# Altium footprint library SoM_Artix.PcbLib: 239 footprints (part 7 of 15)
Each footprint in its own frame and in the unit in brackets; x right, y up, seen from the top. Pads: shape width x height; smd on the part's side, far side on the other; paste and mask are expansions set on the pad; w line width, h text height; cw(c..) or ccw(c..) is an arc to the next point about the centre after c.
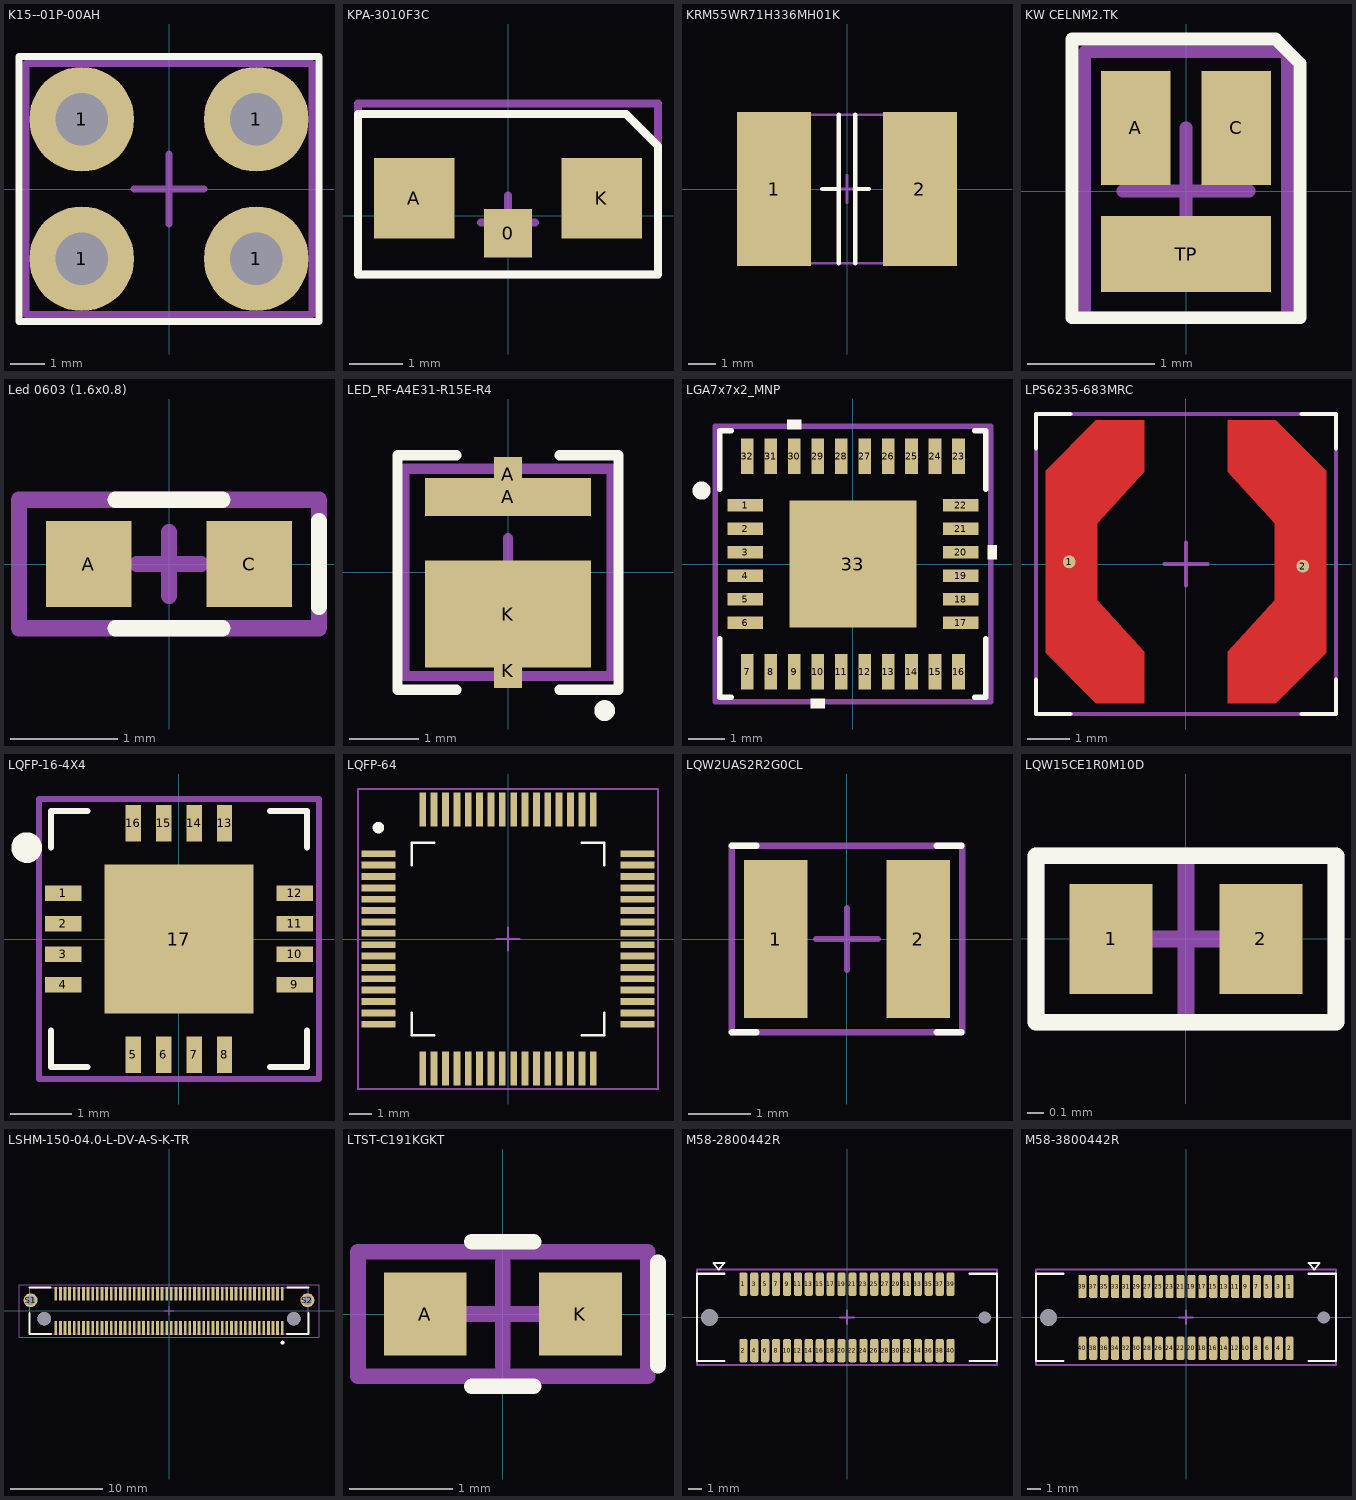
[diagram p6: the footprints below, top view; thin cyan lines are the x and y axes]

## K15--01P-00AH [mm]
height 7
pads (4):
  round 3 hole 1.5: 1(-2.5,-2) 1(-2.5,2) 1(2.5,-2) 1(2.5,2)
Top Overlay:
  lines w0.2: -4.3,-3.8 4.3,-3.8 4.3,3.8 -4.3,3.8 -4.3,-3.8
Mechanical 13:
  lines w0.2: -1,0 1,0 ; 0,-1 0,1 ; -4.1,-3.6 4.1,-3.6 4.1,3.6 -4.1,3.6 -4.1,-3.6
3D body "9586.10.02.105#Контакт.STEP": height 7.2, standoff -2.8, extent -4,-3.5 4,3.5

## KPA-3010F3C [mm]
pads (3):
  rect 0.9x0.9 smd: 0(0,-0.325)
  rect 1.5x1.5 smd: A(-1.75,0.325) K(1.75,0.325)
Top Overlay:
  lines w0.15: -2.8,-1.1 -2.8,1.9 2.2,1.9 2.8,1.3 2.8,-1.1 -2.8,-1.1
Mechanical 15:
  lines w0.15: -0.5,-0.125 0.5,-0.125 ; 0,-0.625 0,0.375 ; -2.8,-1.1 -2.8,2.1 2.8,2.1 2.8,-1.1 -2.8,-1.1
3D body "User Library-APA3010GCCK_GREEN.step": height 1, standoff 0, extent -1.5,-0.15 1.5,1.85

## KRM55WR71H336MH01K [mm]
height 4.8
pads (2):
  rect 2.7x5.6 smd: 1(-2.65,0) 2(2.65,0)
Top Overlay:
  lines w0.15: -0.9,0 -0.3,0 ; -0.3,-2.7 -0.3,2.7 ; 0.3,-2.7 0.3,2.7 ; 0.3,0 0.8,0
Mechanical 13:
  lines w0.1: -0.5,0 0.5,0 ; 0,-0.5 0,0.5 ; -3.2,-2.7 3.2,-2.7 3.2,2.7 -3.2,2.7 -3.2,-2.7
3D body "User Library-KMR55_murata v2.step": height 6.6, standoff 0, extent -3.24,-2.65 3.197,2.658

## KW CELNM2.TK [mm]
pads (3):
  rect 0.55x0.9 smd paste-0.05 mask+0: A(-0.398,0.498) C(0.398,0.498)
  rect 1.34x0.6 smd paste-2539.97 mask+0: TP(0,-0.498)
Top Overlay:
  lines w0.1: -0.9,-1 0.9,-1 0.9,1.007 0.707,1.2 -0.9,1.2 -0.9,-1
Top Paste:
  region: 0.62,-0.25 0.12,-0.25 0.12,-0.75 0.62,-0.75
  rectangle: -0.62,-0.75 -0.12,-0.25
Mechanical 15:
  lines w0.1: -0.5,0 0.5,0 ; 0,-0.5 0,0.5 ; -0.8,-1 0.8,-1 0.8,1.1 -0.8,1.1 -0.8,-1
3D body "KW_CELNM2_TK.STEP": height 0.73, standoff 0, extent -0.75,-0.879 0.75,1.021

## Led 0603 (1.6x0.8) [mm]
pads (2):
  rect 0.8x0.8 smd mask+0.07: A(-0.75,0) C(0.75,0)
Top Overlay:
  lines w0.15: -0.5,-0.6 0.5,-0.6 ; -0.5,0.6 0.5,0.6 ; 1.4,-0.4 1.4,0.4
Mechanical 15:
  lines w0.15: -0.3,0 0.3,0 ; 0,-0.3 0,0.3 ; -1.4,-0.6 -1.4,0.6 1.4,0.6 1.4,-0.6 -1.4,-0.6
3D body "User Library-LED_0603_G.STEP": height 0.6, standoff 0, extent -0.8,-0.4 0.8,0.4

## LED_RF-A4E31-R15E-R4 [mm]
pads (4):
  rect 2.4x0.55 smd: A(0,1.095)
  rect 0.4x0.5 smd: A(0,1.425) K(0,-1.425)
  rect 2.4x1.55 smd: K(0,-0.605)
Top Overlay:
  circle w0.2: c1.4,-2 r0.05
  lines w0.15: -0.75,-1.7 -1.6,-1.7 -1.6,1.7 -0.75,1.7 ; 0.75,-1.7 1.6,-1.7 1.6,1.7 0.75,1.7
Mechanical 13:
  lines w0.15: -0.5,0 0.5,0 ; 0,-0.5 0,0.5 ; -1.5,-1.5 1.5,-1.5 1.5,1.5 -1.5,1.5 -1.5,-1.5
3D body "User Library-LED-3030.STEP": height 0.51, standoff 0, extent -1.524,-1.524 1.524,1.524

## LGA7x7x2_MNP [mil]
pads (33):
  rect 39x14 smd paste+0 mask+1.97: 1(-117.5,63.98) 2(-117.5,38.39) 3(-117.5,12.8) 4(-117.5,-12.8) 5(-117.5,-38.39) 6(-117.5,-63.98) 17(117.5,-63.98) 18(117.5,-38.39) 19(117.5,-12.8) 20(117.5,12.8) 21(117.5,38.39) 22(117.5,63.98)
  rect 14x39 smd paste+0 mask+1.97: 7(-115.16,-117.5) 8(-89.57,-117.5) 9(-63.98,-117.5) 10(-38.39,-117.5) 11(-12.8,-117.5) 12(12.8,-117.5) 13(38.39,-117.5) 14(63.98,-117.5) 15(89.57,-117.5) 16(115.16,-117.5) 23(115.16,117.5) 24(89.57,117.5) 25(63.98,117.5) 26(38.39,117.5) 27(12.8,117.5) 28(-12.8,117.5) 29(-38.39,117.5) 30(-63.98,117.5) 31(-89.57,117.5) 32(-115.16,117.5)
  rect 138x138 smd paste-68.5 mask+1.97: 33(0,0)
Top Overlay:
  circle w9.84: c-165,80 r5
  region: -30.89,-147 -45.89,-147 -45.89,-157 -30.89,-157
  region: 147,20.3 157,20.3 157,5.3 147,5.3
  region: -56.48,147 -71.48,147 -71.48,157 -56.48,157
  lines w6: -145,-81.35 -145,-145 -132.53,-145 ; -145,81.35 -145,145 -132.53,145 ; 132.53,-145 145,-145 145,-81.35 ; 132.53,145 145,145 145,81.35
Top Paste:
  region: -3.94,65.06 -65.06,65.06 -65.06,3.94 -3.94,3.94
  region: -3.94,-3.94 -65.06,-3.94 -65.06,-65.06 -3.94,-65.06
  region: 65.06,65.06 3.94,65.06 3.94,3.94 65.06,3.94
  region: 65.06,-3.94 3.94,-3.94 3.94,-65.06 65.06,-65.06
Mechanical 15:
  lines w6: -150,-150 -150,-80.98 -150,80.98 -150,150 -132.16,150 132.16,150 150,150 150,80.98 150,-80.98 150,-150 132.16,-150 -132.16,-150 -150,-150
3D body "LGA7x7x2_MNP.step": height 83.11, standoff 0, extent -140,-140 140,140

## LPS6235-683MRC [mm]
pads (2):
  round 0.3 smd mask+0.102: 1(-2.725,0.05) 2(2.725,-0.05)
Top Layer:
  region: -2.1,-3.25 -3.275,-2.075 -3.275,2.175 -2.1,3.35 -0.975,3.35 -0.975,2.15 -2.075,0.95 -2.075,-0.85 -0.975,-2.05 -0.975,-3.25
  region: 2.1,-3.25 3.275,-2.075 3.275,2.175 2.1,3.35 0.975,3.35 0.975,2.15 2.075,0.95 2.075,-0.85 0.975,-2.05 0.975,-3.25
Top Overlay:
  lines w0.1: -3.5,-2.7 -3.5,-3.5 -2.7,-3.5 ; -3.5,2.7 -3.5,3.5 -2.7,3.5 ; 2.7,-3.5 3.5,-3.5 3.5,-2.7 ; 2.7,3.5 3.5,3.5 3.5,2.7
Mechanical 15:
  lines w0.1: -0.5,0 0.5,0 ; 0,-0.5 0,0.5 ; -3.5,-3.5 -3.5,3.5 3.5,3.5 3.5,-3.5 -3.5,-3.5
3D body "Coilcraft-LPS6235.step": height 3.5, standoff 0, extent -3.038,-3.038 3.038,3.038

## LQFP-16-4X4 [mm]
pads (17):
  rect 0.6x0.25 smd mask+0.05: 1(-1.9,0.75) 2(-1.9,0.25) 3(-1.9,-0.25) 4(-1.9,-0.75) 9(1.9,-0.75) 10(1.9,-0.25) 11(1.9,0.25) 12(1.9,0.75)
  rect 0.25x0.6 smd mask+0.05: 5(-0.75,-1.9) 6(-0.25,-1.9) 7(0.25,-1.9) 8(0.75,-1.9) 13(0.75,1.9) 14(0.25,1.9) 15(-0.25,1.9) 16(-0.75,1.9)
  rect 2.45x2.45 smd mask+0.05: 17(0,0)
Top Overlay:
  circle w0.25: c-2.5,1.5 r0.127
  lines w0.1: -2.1,-1.5 -2.1,-2.1 -1.5,-2.1 ; -2.1,1.5 -2.1,2.1 -1.5,2.1 ; 1.5,-2.1 2.1,-2.1 2.1,-1.5 ; 1.5,2.1 2.1,2.1 2.1,1.5
Mechanical 15:
  lines w0.1: -0.5,0 0.5,0 ; 0,-0.5 0,0.5 ; -2.3,-2.3 2.3,-2.3 2.3,2.3 -2.3,2.3 -2.3,-2.3
3D body "User Library-WQFN-16 4x4mm 0_5mmPitch.step": height 0.8, standoff -0.01, extent -2.01,-2.01 2.01,2.01

## LQFP-64 [mm]
pads (64):
  rect 1.5x0.3 smd mask+0.05: 1(-5.7,3.75) 2(-5.7,3.25) 3(-5.7,2.75) 4(-5.7,2.25) 5(-5.7,1.75) 6(-5.7,1.25) 7(-5.7,0.75) 8(-5.7,0.25) 9(-5.7,-0.25) 10(-5.7,-0.75) 11(-5.7,-1.25) 12(-5.7,-1.75) 13(-5.7,-2.25) 14(-5.7,-2.75) 15(-5.7,-3.25) 16(-5.7,-3.75) 33(5.7,-3.75) 34(5.7,-3.25) 35(5.7,-2.75) 35(5.7,-1.25) 36(5.7,-2.25) 37(5.7,-1.75) 39(5.7,-0.75) 40(5.7,-0.25) 41(5.7,0.25) 42(5.7,0.75) 43(5.7,1.25) 44(5.7,1.75) 45(5.7,2.25) 46(5.7,2.75) 47(5.7,3.25) 48(5.7,3.75)
  rect 0.3x1.5 smd mask+0.05: 17(-3.75,-5.7) 18(-3.25,-5.7) 19(-2.75,-5.7) 20(-2.25,-5.7) 21(-1.75,-5.7) 22(-1.25,-5.7) 23(-0.75,-5.7) 24(-0.25,-5.7) 25(0.25,-5.7) 26(0.75,-5.7) 27(1.25,-5.7) 28(1.75,-5.7) 29(2.25,-5.7) 30(2.75,-5.7) 31(3.25,-5.7) 32(3.75,-5.7) 49(3.75,5.7) 50(3.25,5.7) 51(2.75,5.7) 52(2.25,5.7) 53(1.75,5.7) 54(1.25,5.7) 55(0.75,5.7) 56(0.25,5.7) 57(-0.25,5.7) 58(-0.75,5.7) 59(-1.25,5.7) 60(-1.75,5.7) 61(-2.25,5.7) 62(-2.75,5.7) 63(-3.25,5.7) 64(-3.75,5.7)
Top Overlay:
  circle w0.25: c-5.7,4.9 r0.127
  lines w0.1: -4.238,-3.237 -4.238,-4.237 -3.238,-4.237 ; -4.237,3.238 -4.237,4.238 -3.237,4.238 ; 3.237,-4.238 4.237,-4.238 4.237,-3.238 ; 3.238,4.237 4.238,4.237 4.238,3.237
Mechanical 15:
  lines w0.1: -0.5,0 0.5,0 ; 0,-0.5 0,0.5 ; -6.6,-6.6 -6.6,6.6 6.6,6.6 6.6,-6.6 -6.6,-6.6
3D body "User Library-LQFP64-2.STEP": height 1.62, standoff -0.01, extent -6.072,-6.072 6.072,6.072

## LQW2UAS2R2G0CL [mm]
pads (2):
  rect 1.02x2.54 smd mask+0.05: 1(-1.145,0) 2(1.145,0)
Top Overlay:
  lines w0.1: -1.855,-1.5 -1.455,-1.5 ; -1.855,1.5 -1.455,1.5 ; 1.445,-1.5 1.845,-1.5 ; 1.445,1.5 1.845,1.5
Mechanical 15:
  lines w0.1: -0.5,0 0.5,0 ; 0,-0.5 0,0.5 ; -1.855,-1.5 -1.855,1.5 1.855,1.5 1.855,-1.5 -1.855,-1.5
3D body "Coilcraft-1008CS.step": height 2.48, standoff -0.01, extent -1.46,-1.395 1.46,1.395

## LQW15CE1R0M10D [mm]
pads (2):
  rect 0.5x0.66 smd mask+0.05: 1(-0.45,0) 2(0.45,0)
Top Overlay:
  lines w0.1: -0.9,-0.5 -0.9,0.5 0.9,0.5 0.9,-0.5 -0.9,-0.5
Mechanical 15:
  lines w0.1: -0.5,0 0.5,0 ; 0,-0.5 0,0.5 ; -0.9,-0.5 0.9,-0.5 0.9,0.5 -0.9,0.5 -0.9,-0.5
3D body "User Library-INDC1005X50-MURATA_LQW15A.step": height 0.51, standoff 0, extent -0.5,-0.3 0.5,0.3

## LSHM-150-04.0-L-DV-A-S-K-TR [mm]
height 5.6
pads (104):
  rect 0.3x1.5 smd: 1(12.25,-1.85) 2(12.25,1.85) 3(11.75,-1.85) 4(11.75,1.85) 5(11.25,-1.85) 6(11.25,1.85) 7(10.75,-1.85) 8(10.75,1.85) 9(10.25,-1.85) 10(10.25,1.85) 11(9.75,-1.85) 12(9.75,1.85) 13(9.25,-1.85) 14(9.25,1.85) 15(8.75,-1.85) 16(8.75,1.85) 17(8.25,-1.85) 18(8.25,1.85) 19(7.75,-1.85) 20(7.75,1.85) 21(7.25,-1.85) 22(7.25,1.85) 23(6.75,-1.85) 24(6.75,1.85) 25(6.25,-1.85) 26(6.25,1.85) 27(5.75,-1.85) 28(5.75,1.85) 29(5.25,-1.85) 30(5.25,1.85) 31(4.75,-1.85) 32(4.75,1.85) 33(4.25,-1.85) 34(4.25,1.85) 35(3.75,-1.85) 36(3.75,1.85) 37(3.25,-1.85) 38(3.25,1.85) 39(2.75,-1.85) 40(2.75,1.85) 41(2.25,-1.85) 42(2.25,1.85) 43(1.75,-1.85) 44(1.75,1.85) 45(1.25,-1.85) 46(1.25,1.85) 47(0.75,-1.85) 48(0.75,1.85) 49(0.25,-1.85) 50(0.25,1.85) 51(-0.25,-1.85) 52(-0.25,1.85) 53(-0.75,-1.85) 54(-0.75,1.85) 55(-1.25,-1.85) 56(-1.25,1.85) 57(-1.75,-1.85) 58(-1.75,1.85) 59(-2.25,-1.85) 60(-2.25,1.85) 61(-2.75,-1.85) 62(-2.75,1.85) 63(-3.25,-1.85) 64(-3.25,1.85) 65(-3.75,-1.85) 66(-3.75,1.85) 67(-4.25,-1.85) 68(-4.25,1.85) 69(-4.75,-1.85) 70(-4.75,1.85) 71(-5.25,-1.85) 72(-5.25,1.85) 73(-5.75,-1.85) 74(-5.75,1.85) 75(-6.25,-1.85) 76(-6.25,1.85) 77(-6.75,-1.85) 78(-6.75,1.85) 79(-7.25,-1.85) 80(-7.25,1.85) 81(-7.75,-1.85) 82(-7.75,1.85) 83(-8.25,-1.85) 84(-8.25,1.85) 85(-8.75,-1.85) 86(-8.75,1.85) 87(-9.25,-1.85) 88(-9.25,1.85) 89(-9.75,-1.85) 90(-9.75,1.85) 91(-10.25,-1.85) 92(-10.25,1.85) 93(-10.75,-1.85) 94(-10.75,1.85) 95(-11.25,-1.85) 96(-11.25,1.85) 97(-11.75,-1.85) 98(-11.75,1.85) 99(-12.25,-1.85) 100(-12.25,1.85)
  round 1.5 hole 1: S1(-14.975,1.15) S2(14.975,1.15)
  round 1.45 hole 1.45 unplated: ""(-13.5,-0.85) ""(13.5,-0.85)
Top Overlay:
  circle w0.2: c12.279,-3.429 r0.1
  lines w0.2: -15.075,-0.3 -15.075,-2.49 ; -15.075,-0.2 -15.075,-2.49 ; -15.075,2.51 -12.8,2.51 ; -12.8,-2.49 -15.075,-2.49 ; -12.75,-2.49 -15.075,-2.49 ; 12.75,-2.49 15.075,-2.49 ; 12.8,2.51 15.075,2.51 ; 15.075,-0.3 15.075,-2.49 ; 15.075,-0.2 15.075,-2.49
Top Paste:
  circle w1: c14.975,1.15 r0.5
  circle w1: c-14.975,1.15 r0.5
Mechanical 13:
  circle w0.2: c12.279,-3.429 r0.1
  lines w0.1: -15.075,-2.49 15.075,-2.49 15.075,2.49 -15.075,2.49 -15.075,-2.49
Mechanical 15:
  lines w0.05: -16.225,-2.85 16.225,-2.85 16.225,2.85 -16.225,2.85 -16.225,-2.85
  lines w0.1: -0.5,0 0.5,0 ; 0,-0.5 0,0.5
3D body "LSHM-150-04.0-L-DV-A-S-K-TR.stp": height 5.58, standoff -1.67, extent -15.4,-2.49 15.401,2.54

## LTST-C191KGKT [mm]
pads (2):
  rect 0.8x0.8 smd: A(-0.75,0) K(0.75,0)
Top Overlay:
  lines w0.15: -0.3,-0.7 0.3,-0.7 ; -0.3,0.7 0.3,0.7 ; 1.5,-0.5 1.5,0.5
Mechanical 15:
  lines w0.15: -0.5,0 0.5,0 ; 0,-0.5 0,0.5 ; -1.4,-0.6 -1.4,0.6 1.4,0.6 1.4,-0.6 -1.4,-0.6
3D body "User Library-LTST-C190GKT.STEP": height 0.9, standoff 0, extent -0.8,-0.45 0.9,0.45

## M58-2800442R [mm]
height 3.7
pads (42):
  rrect50% 0.6x1.72 smd paste-2539.97: 1(-7.6,2.435) 2(-7.6,-2.435) 3(-6.8,2.435) 4(-6.8,-2.435) 5(-6,2.435) 6(-6,-2.435) 7(-5.2,2.435) 8(-5.2,-2.435) 9(-4.4,2.435) 10(-4.4,-2.435) 11(-3.6,2.435) 12(-3.6,-2.435) 13(-2.8,2.435) 14(-2.8,-2.435) 15(-2,2.435) 16(-2,-2.435) 17(-1.2,2.435) 18(-1.2,-2.435) 19(-0.4,2.435) 20(-0.4,-2.435) 21(0.4,2.435) 22(0.4,-2.435) 23(1.2,2.435) 24(1.2,-2.435) 25(2,2.435) 26(2,-2.435) 27(2.8,2.435) 28(2.8,-2.435) 29(3.6,2.435) 30(3.6,-2.435) 31(4.4,2.435) 32(4.4,-2.435) 33(5.2,2.435) 34(5.2,-2.435) 35(6,2.435) 36(6,-2.435) 37(6.8,2.435) 38(6.8,-2.435) 39(7.6,2.435) 40(7.6,-2.435)
  rect 0x0 hole 1.25 unplated: NC(-10.1,0)
  rect 0x0 hole 0.9 unplated: NC(10.1,0)
Top Overlay:
  lines w0.15: -9,-3.2 -11,-3.2 -11,3.2 -9,3.2 ; 9,-3.2 11,-3.2 11,3.2 9,3.2 ; -9.8,4 -9.4,3.5 -9,4 -9.8,4
Top Paste:
  drawing of 40 lines, arcs and shapes, not listed
Mechanical 13:
  lines w0.15: -0.5,0 0.5,0 ; 0,-0.5 0,0.5 ; -11,-3.5 11,-3.5 11,3.5 -11,3.5 -11,-3.5
3D body "m58-2800442_asm.stp": height 3.67, standoff -0.72, extent -10.875,-3 10.875,3

## M58-3800442R [mm]
pads (42):
  rrect50% 0.6x1.72 smd: 1(7.6,2.265) 2(7.6,-2.265) 3(6.8,2.265) 4(6.8,-2.265) 5(6,2.265) 6(6,-2.265) 7(5.2,2.265) 8(5.2,-2.265) 9(4.4,2.265) 10(4.4,-2.265) 11(3.6,2.265) 12(3.6,-2.265) 13(2.8,2.265) 14(2.8,-2.265) 15(2,2.265) 16(2,-2.265) 17(1.2,2.265) 18(1.2,-2.265) 19(0.4,2.265) 20(0.4,-2.265) 21(-0.4,2.265) 22(-0.4,-2.265) 23(-1.2,2.265) 24(-1.2,-2.265) 25(-2,2.265) 26(-2,-2.265) 27(-2.8,2.265) 28(-2.8,-2.265) 29(-3.6,2.265) 30(-3.6,-2.265) 31(-4.4,2.265) 32(-4.4,-2.265) 33(-5.2,2.265) 34(-5.2,-2.265) 35(-6,2.265) 36(-6,-2.265) 37(-6.8,2.265) 38(-6.8,-2.265) 39(-7.6,2.265) 40(-7.6,-2.265)
  rect 0x0 hole 1.25 unplated: NC(-10.1,0)
  rect 0x0 hole 0.9 unplated: NC(10.1,0)
Top Overlay:
  lines w0.15: -9,-3.2 -11,-3.2 -11,3.2 -9,3.2 ; 9,-3.2 11,-3.2 11,3.2 9,3.2 ; 9,4 9.8,4 9.4,3.5 9,4
Mechanical 13:
  lines w0.15: -0.5,0 0.5,0 ; 0,-0.5 0,0.5 ; -11,-3.5 -11,3.5 11,3.5 11,-3.5 -11,-3.5
3D body "m58-3800442_asm.stp": height 4.78, standoff -0.64, extent -10.875,-2.99 10.875,2.99